# Altium footprint library 集大电协1.2.PcbLib: 197 footprints (part 2 of 13)
Each footprint in its own frame and in the unit in brackets; x right, y up, seen from the top. Pads: shape width x height; smd on the part's side, far side on the other; paste and mask are expansions set on the pad; w line width, h text height; cw(c..) or ccw(c..) is an arc to the next point about the centre after c.
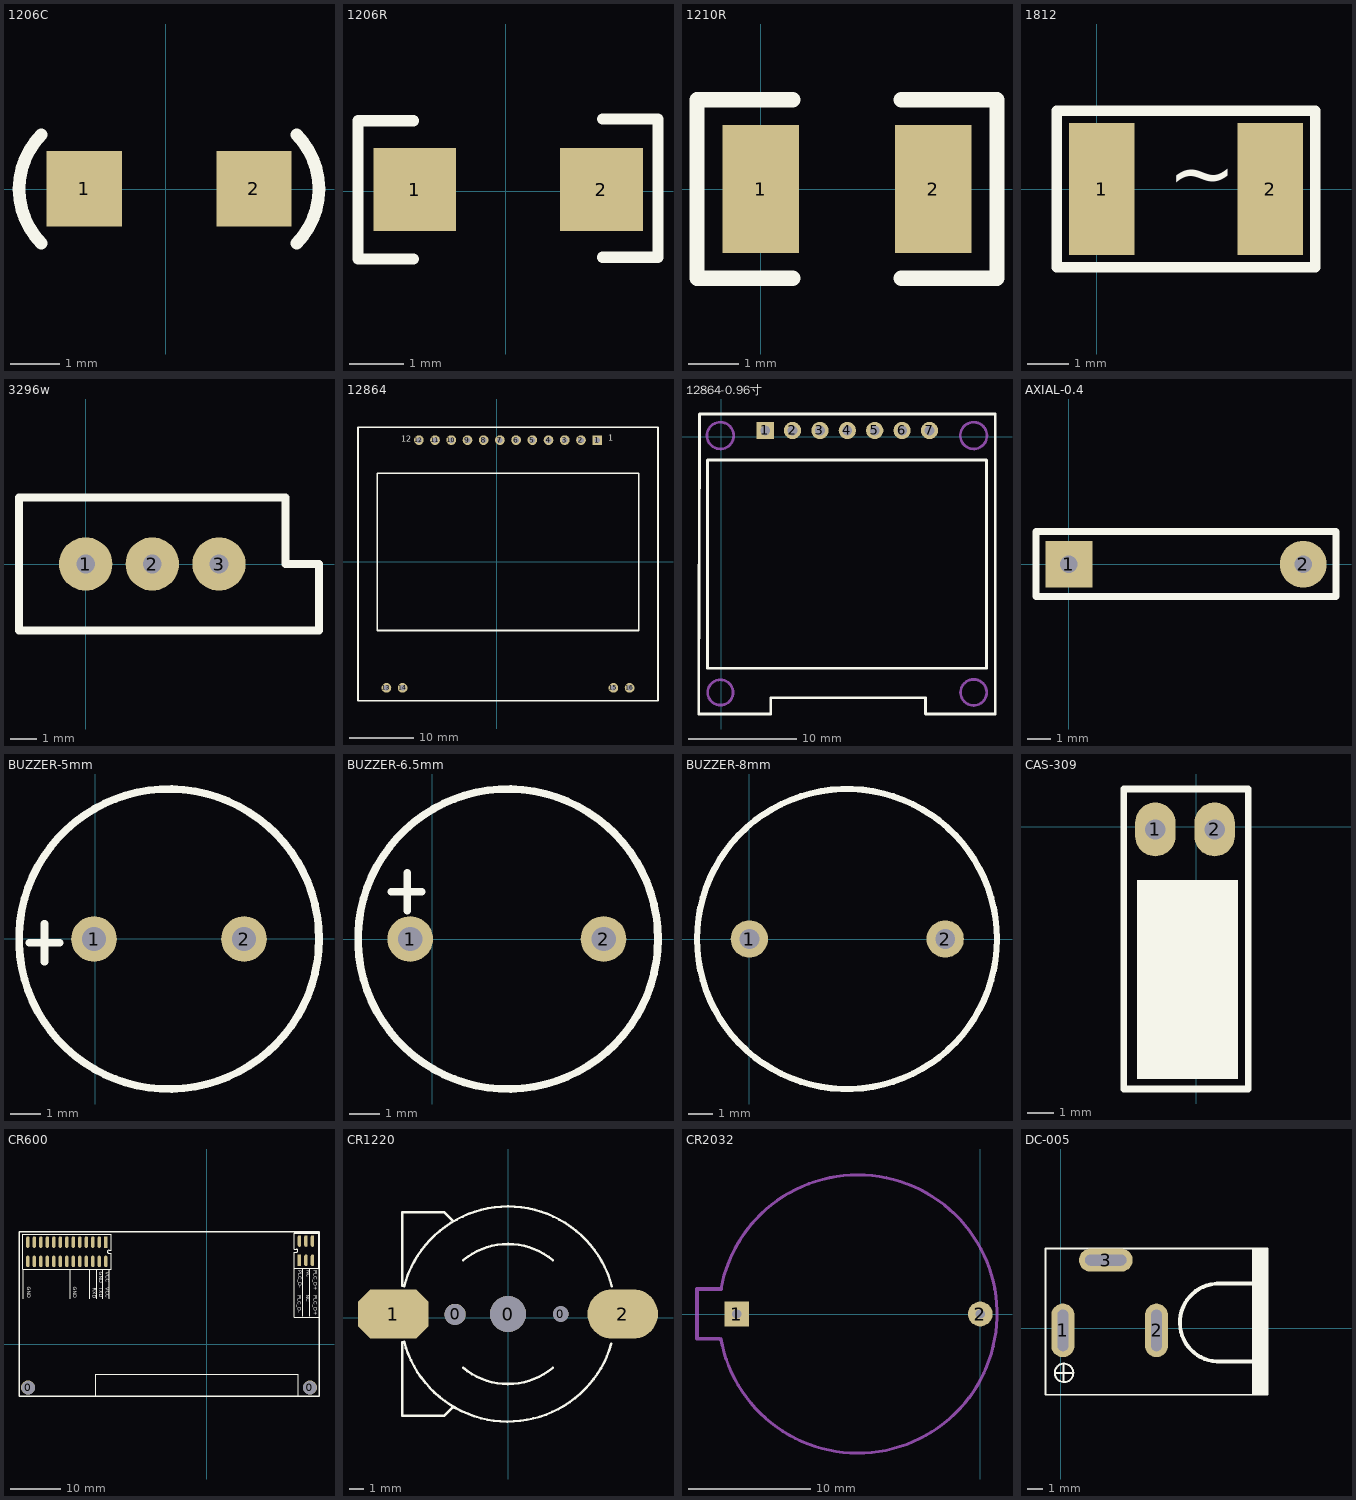
[diagram p1: the footprints below, top view; thin cyan lines are the x and y axes]

## 1206C [mil]
pads (2):
  rect 60x60 smd: 1(-64.9,0.2) 2(70.1,0.2)
Top Overlay:
  lines w10: -99,-43 cw(c-56,0) -99,43 ; 104,-43 ccw(c61,0) 104,43
3D body "Capacitor 1206 SMD.step": height 37.4, standoff -0.39, extent -81.71,-36.1 83.64,34.77

## 1206R [mil]
pads (2):
  rect 60x60 smd: 1(-65.9,1.2) 2(69.1,1.2)
Top Overlay:
  lines w8: -66.9,-49 -107,-49 -107,51 -66.9,51 ; 70,-47.8 110.1,-47.8 110.1,52.2 70,52.2
3D body "R1206.STEP": height 23.62, standoff 0, extent -62.99,-30.49 63,32.5

## 1210R [mil]
pads (2):
  rect 60x100 smd: 1(0,0) 2(135,0)
Top Overlay:
  lines w12: 25,-70 -50,-70 -50,70 25,70 ; 110,-70 185,-70 185,70 110,70
3D body "RES1210.STEP": height 67.1, standoff 0, extent -11.74,-48.99 145.76,49

## 1812 [mm]
pads (2):
  rect 1.6x3.2 smd: 1(0.127,0) 2(4.227,0)
Top Overlay:
  lines w0.254: -0.973,-1.9 5.327,-1.9 5.327,1.9 -0.973,1.9 -0.973,-1.9
  text "~" at 1.727,-0.787 h2.5
3D body "Resistor 1812 SMD.step": height 1.6, standoff 0, extent -0.066,-1.6 4.434,1.6

## 3296w [mil]
pads (3):
  round 80 hole 28: 1(0,0) 2(100,0) 3(200,0)
Top Overlay:
  lines w12: -100,-100 -100,100 300,100 300,0 350,0 350,-100 -100,-100
3D body "CERMET TRIMMER SINGLE TURN 10MM 500MW SIDE ADJUST 3386W.step": height 375.2, standoff -196.85, extent -87.6,-96.16 287.6,94

## 12864 [mil]
pads (16):
  rect 60x60 hole 35: 1(620,748.78)
  round 60 hole 35: 2(520,748.78) 3(420,748.78) 4(320,748.78) 5(220,748.78) 6(120,748.78) 7(20,748.78) 8(-80,748.78) 9(-180,748.78) 10(-280,748.78) 11(-380,748.78) 12(-480,748.78) 13(-680,-778.78) 14(-580,-778.78) 15(720,-778.78) 16(820,-778.78)
Top Overlay:
  lines w10: -855.2,-857.52 995.2,-857.52 995.2,827.52 -855.2,827.52 -855.2,-857.52 ; -735.91,-424.84 875.91,-424.84 875.91,544.45 -735.91,544.45 -735.91,-424.84
  text "1" at 689.8,733.48 h60
  text "12" at -588.2,726.48 h60
3D body: height 45, standoff 30, extent -744,-427 879,545
3D body: height 30, standoff 0, extent -856,-861 994,830
3D body "HDR1X4_2.54mm.STEP": height 118.11, standoff -336.22, extent 278,695 678,795
3D body "HDR1X8_2.54mm.STEP": height 118.11, standoff -336.22, extent -522,695 278,795

## 12864-0.96寸 [mm]
pads (7):
  rect 1.6x1.6 hole 0.9: 1(4.061,0.59)
  round 1.6 hole 0.9: 2(6.601,0.59) 3(9.141,0.59) 4(11.681,0.59) 5(14.221,0.59) 6(16.761,0.59) 7(19.301,0.59)
Top Overlay:
  lines w0.254: -1.289,-2.232 -1.289,-21.46 24.592,-21.46 24.592,-2.156 -1.289,-2.156 ; 25.392,2.101 25.392,-25.699 18.92,-25.699 18.92,-24.199 4.592,-24.199 4.592,-25.699 -2.089,-25.699 -2.028,2.114 25.392,2.114
Mechanical 13:
  circle w0.254: c23.392,0.114 r1.238
  circle w0.254: c-0.089,0.114 r1.239
  circle w0.254: c23.392,-23.699 r1.208
  circle w0.254: c-0.089,-23.699 r1.176
3D body "User Library-128x64I2COLEDDisplayAdafruit.step": height 2.67, standoff -8.17, extent -1.724,-25.564 24.976,2.296
3D body: height 0.25, standoff 0, extent -2.035,2.368 -2.035,2.368

## AXIAL-0.4 [mil]
pads (2):
  rect 80x80 hole 30: 1(0,0)
  round 80 hole 30: 2(400,0)
Top Overlay:
  lines w12: -56,-55 456,-55 456,56 -56,56 -56,-55
3D body: height 139.21, standoff -100, extent -13.17,-68.75 408.83,69.88

## BUZZER-5mm [mil]
pads (2):
  round 60 hole 32 mask+0: 1(-1.46,-0.35) 2(195.39,-0.35)
Top Overlay:
  circle w10: c96.97,-0.35 r196.85
  lines w10: -86.46,-5.35 -46.46,-5.35 ; -66.46,-30.35 -66.46,19.65
3D body "蜂?": height 354.33, standoff -78.74, extent -142.67,-236.57 329.77,235.87

## BUZZER-6.5mm [mil]
pads (2):
  round 60 hole 32 mask+0: 1(-29,0) 2(224.85,0)
Top Overlay:
  circle w10: c99.43,0 r196.85
  lines w10: -54,62 -14,62 ; -33,37 -33,87
3D body "蜂?": height 354.33, standoff -78.74, extent -140.21,-236.21 332.23,236.23

## BUZZER-8mm [mil]
pads (2):
  round 60 hole 32 mask+0: 1(0,0) 2(314.96,0)
Top Overlay:
  circle w10: c157,0 r241.2
3D body: height 379.92, standoff -177.17, extent -81.05,-238.44 527.05,234

## CAS-309 [mil]
pads (2):
  oval 60x80 hole 30: 1(-61,-4) 2(27,-4)
Top Overlay:
  rectangle: -88,-374 62,-79
  lines w10: -108,-389 77,-389 77,56 -108,56 -108,-389
3D body: height 365.16, standoff -59.06, extent -81.91,-72 53.91,53.94

## CR600 [mm]
pads (34):
  round 2.8 hole 2.7: 0(-35.7,-8.7) 0(20.7,-8.7)
  rect 0.7x2.3 smd: 1(-20.14,20.374) 31(18.594,16.739)
  oval 0.7x2.3 smd: 2(-20.14,16.524) 3(-21.44,20.374) 4(-21.44,16.524) 5(-22.74,20.374) 6(-22.74,16.524) 7(-24.04,20.374) 8(-24.04,16.524) 9(-25.34,20.374) 10(-25.34,16.524) 11(-26.64,20.374) 12(-26.64,16.524) 13(-27.94,20.374) 14(-27.94,16.524) 15(-29.24,20.374) 16(-29.24,16.524) 17(-30.54,20.374) 18(-30.54,16.524) 19(-31.84,20.374) 20(-31.84,16.524) 21(-33.14,20.374) 22(-33.14,16.524) 23(-34.44,20.374) 24(-34.44,16.524) 25(-35.74,20.374) 26(-35.74,16.524) 32(18.594,20.589) 33(19.894,16.739) 34(19.894,20.589) 35(21.194,16.739) 36(21.194,20.589)
Top Overlay:
  lines w0.127: -36.7,9.1 -36.7,14.9 ; -27.3,9.1 -27.3,14.9 ; -23.4,9.1 -23.4,14.9 ; -22.2,-10.5 -22.2,-6 18.4,-6 18.4,-10.5 ; -22,9.1 -22,14.9 ; -20.8,9.1 -20.8,14.9 ; -19.5,9.1 -19.5,14.9 ; 17.5,15.113 17.5,5.4 22.5,5.4 ; 19.3,5.51 19.3,15.1 ; 20.7,5.51 20.7,15.1
  lines w0.2: 17.5,15.113 17.5,18.339 17.944,18.339 ccw(c17.944,18.664) 17.944,18.989 17.553,18.989 17.553,22.2 ; -36.726,14.913 -19.099,14.913 -19.099,18.124 -19.49,18.124 cw(c-19.49,18.449) -19.49,18.774 -19.099,18.774 -19.099,22 -36.726,22 -36.726,14.913
  lines w0.203: 17.5,15.113 22.455,15.113
  lines w0.254: 17.553,22.2 22.379,22.2 ; 22.43,15.139 22.455,15.113 22.455,22.124 ; -37.5,-10.5 -37.5,22.5 22.5,22.5 22.5,-10.5 -37.5,-10.5
  text "NC" at 19.7,14.704 h1.27
  text "PLC_D-" at 18.1,14.7 h1.27
  text "PLC_D+" at 21.1,14.7 h1.27
  text "VCC" at -20.5,14.404 h1.27
  text "VCC" at -20.5,11.304 h1.27
  text "TXD" at -21.8,11.304 h1.27
  text "GND" at -21.8,14.404 h1.27
  text "RXD" at -23.1,11.3 h1.27
  text "GND" at -27,11.5 h1.27
  text "GND" at -36.2,11.5 h1.27
  text "PLC_D+" at 21.1,9.8 h1.27
  text "PLC_D-" at 18,9.8 h1.27
  text "NC" at 19.6,9.804 h1.27

## CR1220 [mm]
pads (5):
  round 1.5 hole 1.5: 0(-3.75,0.229)
  round 2.54 hole 2.54: 0(0,0.254)
  round 1.1 hole 1.1: 0(3.75,0.254)
  oct 5x3.5 smd: 1(-8.128,0.254)
  oval 5x3.5 smd: 2(8.128,0.254)
Top Overlay:
  lines w0.178: -7.5,-1.746 -7.5,-6.946 -4.5,-6.946 -3.925,-6.371 ; -7.5,2.254 -7.5,7.454 -4.5,7.454 -3.9,6.854 ; -7.363,-1.709 ccw(c0,0.254) 7.327,-1.839 ; -7.363,2.217 cw(c0,0.254) 0,7.874 cw(c0,0.254) 7.363,2.217 ; -3.175,-3.556 ccw(c0,0.254) 3.172,-3.558 ; -3.169,4.069 cw(c0,0.254) 3.172,4.066
3D body "CR1220.STEP": height 4.19, standoff -0.75, extent -9.377,-7.377 9.123,7.62

## CR2032 [mil]
pads (2):
  rect 80x80 hole 30: 1(-787.4,0)
  round 80 hole 30: 2(0,0)
Mechanical 1:
  lines w10: -838.99,-79.11 ccw(c-396,0) -838.73,80.57
  lines w12: -838.73,80.57 -916,80.57 -916,-80 -844,-80 -837.74,-85.84
3D body: height 78.74, standoff 0, extent -788.27,-390.59 -1.3,396.6

## DC-005 [mm]
pads (3):
  oval 1.5x3.5 hole 0.7 slot 2.7 at 90 deg: 1(0.127,-0.127) 2(6.223,-0.127)
  oval 3.5x1.5 hole 0.7 slot 2.7 at 0 deg: 3(2.921,4.445)
Top Overlay:
  circle w0.127: c0.203,-2.896 r0.604
  region: 13.462,-4.318 13.462,5.207 12.446,5.207 12.446,-4.318
  region: 13.462,-4.318 13.462,5.207 12.827,5.207 12.827,-4.318
  lines w0.127: -0.33,-2.896 0.686,-2.896 ; 0.178,-3.404 0.178,-2.388 ; -1.016,-4.318 -1.016,-1.524 -1.016,5.207 13.462,5.207 13.462,-4.318 -1.016,-4.318
  lines w0.254: 10.16,-2.159 13.183,-2.159 ; 10.16,2.921 13.208,2.921 ; 10.287,2.924 ccw(c10.287,0.381) 10.414,-2.159
3D body "SW3dPS-rapc722.STEP": height 10.92, standoff -3.56, extent -0.923,-4.267 13.674,5.258